# Altium footprint library GyokuRe.PcbLib: 1248 footprints (part 49 of 78)
Each footprint in its own frame and in the unit in brackets; x right, y up, seen from the top. Pads: shape width x height; smd on the part's side, far side on the other; paste and mask are expansions set on the pad; w line width, h text height; cw(c..) or ccw(c..) is an arc to the next point about the centre after c.
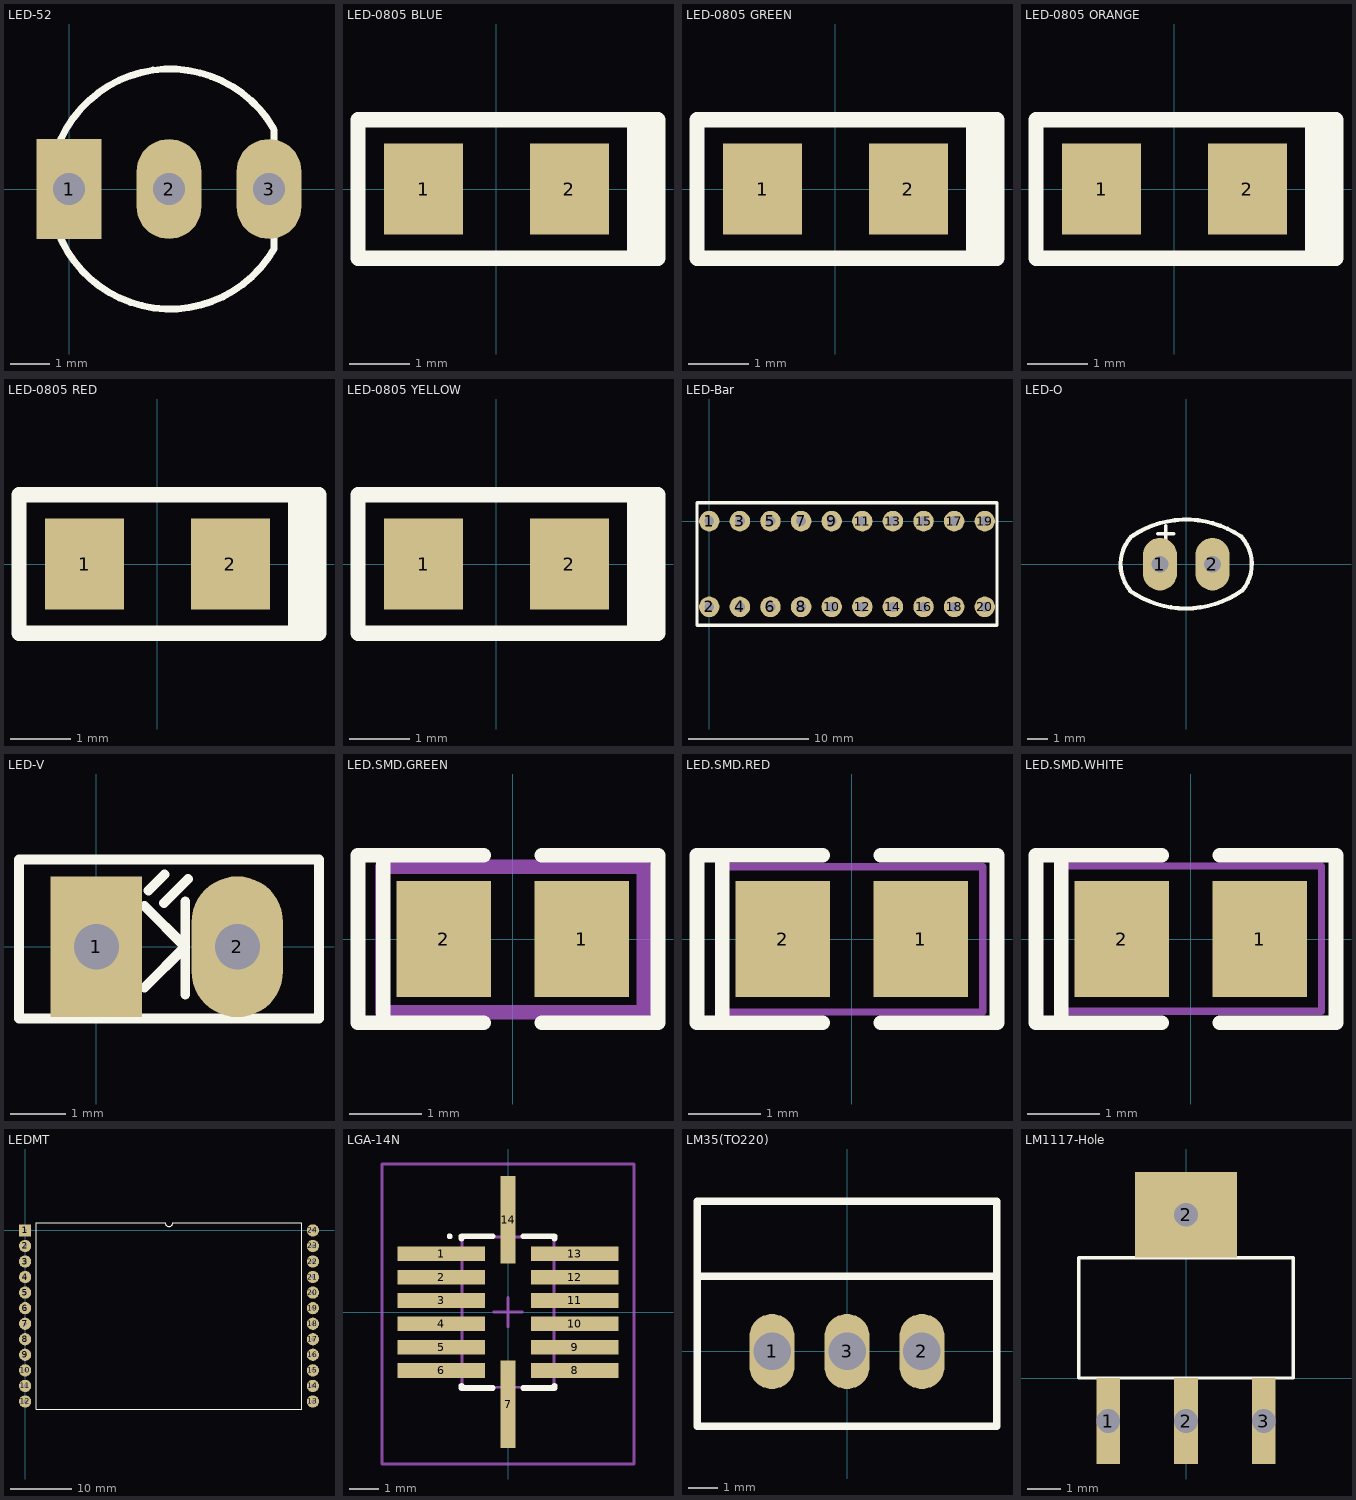
[diagram p48: the footprints below, top view; thin cyan lines are the x and y axes]

## LED-52 [mil] "LED 3 PIN, 5 ly , Two colour"
height 300
pads (3):
  rect 65x100 hole 32: 1(0,0)
  oval 65x100 hole 32: 2(100,0) 3(200,0)
Top Overlay:
  lines w7: 204.51,60.71 ccw(c101,0) 204.94,-59.97 ; 205,-59 205,59

## LED-0805 BLUE [mm] "Chip LED; BLUE; Body 2.0 x 1.3 mm (LxW typ) [2012]"
height 0.65
pads (2):
  rect 1.3x1.5 smd: 1(-1.204,0) 2(1.204,0)
Top Overlay:
  lines w0.254: 2.286,-1.143 2.286,1.143 ; 2.413,-1.143 2.413,1.143 ; 2.54,-1.143 2.54,1.143 ; -2.286,-1.143 2.667,-1.143 2.667,1.143 -2.286,1.143 -2.286,-1.143
3D body "User Library-led_0805(2).step": height 1.1, standoff 0, extent -1.006,-0.628 1.014,0.622

## LED-0805 GREEN [mm] "Chip LED; GREEN; Body 2.0 x 1.3 mm (LxW typ) [2012]"
height 0.65
pads (2):
  rect 1.3x1.5 smd: 1(-1.204,0) 2(1.204,0)
Top Overlay:
  lines w0.254: 2.286,-1.143 2.286,1.143 ; 2.413,-1.143 2.413,1.143 ; 2.54,-1.143 2.54,1.143 ; -2.286,-1.143 -2.286,1.143 2.667,1.143 2.667,-1.143 -2.286,-1.143
3D body "User Library-led_0805(1).step": height 1.1, standoff 0, extent -1.006,-0.628 1.014,0.622

## LED-0805 ORANGE [mm] "Chip LED; ORANGE; Body 2.0 x 1.3 mm (LxW typ) [2012]"
height 0.65
pads (2):
  rect 1.3x1.5 smd: 1(-1.204,0) 2(1.204,0)
Top Overlay:
  lines w0.254: 2.286,-1.143 2.286,1.143 ; 2.413,-1.143 2.413,1.143 ; 2.54,-1.143 2.54,1.143 ; -2.286,-1.143 -2.286,1.143 2.667,1.143 2.667,-1.143 -2.286,-1.143
3D body "User Library-led_0805(4).step": height 1.1, standoff 0, extent -1.006,-0.628 1.014,0.622

## LED-0805 RED [mm] "Chip LED; RED; Body 2.0 x 1.3 mm (LxW typ) [2012]"
height 0.65
pads (2):
  rect 1.3x1.5 smd: 1(-1.204,0) 2(1.204,0)
Top Overlay:
  lines w0.254: 2.286,-1.143 2.286,1.143 ; 2.413,-1.143 2.413,1.143 ; 2.54,-1.143 2.54,1.143 ; -2.286,-1.143 -2.286,1.143 2.667,1.143 2.667,-1.143 -2.286,-1.143
3D body "User Library-led_0805.step": height 1.1, standoff 0, extent -1.006,-0.628 1.014,0.622

## LED-0805 YELLOW [mm] "Chip LED; YELLOW; Body 2.0 x 1.3 mm (LxW typ) [2012]"
height 0.65
pads (2):
  rect 1.3x1.5 smd: 1(-1.204,0) 2(1.204,0)
Top Overlay:
  lines w0.254: 2.286,-1.143 2.286,1.143 ; 2.413,-1.143 2.413,1.143 ; 2.54,-1.143 2.54,1.143 ; -2.286,-1.143 -2.286,1.143 2.667,1.143 2.667,-1.143 -2.286,-1.143
3D body "User Library-led_0805(3).step": height 1.1, standoff 0, extent -1.006,-0.628 1.014,0.622

## LED-Bar [mil] "LED Bar; 10 Indicator; Solder Pad 35mil"
pads (20):
  round 67 hole 32: 1(0,0) 2(0,-280) 3(100,0) 4(100,-280) 5(200,0) 6(200,-280) 7(300,0) 8(300,-280) 9(400,0) 10(400,-280) 11(500,0) 12(500,-280) 13(600,0) 14(600,-280) 15(700,0) 16(700,-280) 17(800,0) 18(800,-280) 19(900,0) 20(900,-280)
Top Overlay:
  lines w10: -40,-340 -40,60 940,60 940,-340 -40,-340

## LED-O [mil] "LED 2 PIN,  Ovan Only colour, pin to pin 110mil"
height 300
pads (2):
  oval 65x100 hole 32: 1(-50,0) 2(50,0)
Top Overlay:
  lines w7: -54,58 -24,58 ; -39,43 -39,73
  lines w8: -106.82,-49.85 cw(c-47,0) -104.5,52.5 ; -106.38,-51.11 ccw(c-0.81,100.81) 104.97,-50.96 ; -102.83,53.79 cw(c0,-100) 103.93,53.04 ; 104.5,52.5 cw(c47,0) 106.82,-49.85

## LED-V [mil] "LED 2 PIN, Rectang Only colour"
height 300
pads (2):
  rect 65x100 hole 32: 1(0,0)
  oval 65x100 hole 32: 2(100,0)
Top Overlay:
  lines w7: 34,-29 63,0 34,29 ; 37,40 48.3,51.3 ; 48,31 65,48 ; 63,-34 63,32 ; -55,-51 -55,62 158,62 158,-51 -55,-51

## LED.SMD.GREEN [mm]
pads (2):
  rect 1.3x1.6 smd: 1(0.948,0.006) 2(-0.952,0.006)
Top Overlay:
  lines w0.2: -1.782,-1.144 -1.782,1.156 ; -0.402,-1.144 -2.132,-1.144 -2.132,1.156 -0.402,1.156 ; 0.398,-1.144 1.998,-1.144 1.998,1.156 0.398,1.156
Mechanical 13:
  lines w0.2: -1.8,-1 -1.8,1 1.8,1 1.8,-1 -1.8,-1
3D body: height 1.14, standoff 0.61, extent -0.699,-0.635 0.699,0.635
3D body: height 0.61, standoff 0, extent -1.079,-0.635 1.079,0.635

## LED.SMD.RED [mm]
pads (2):
  rect 1.3x1.6 smd: 1(0.948,0.006) 2(-0.952,0.006)
Top Overlay:
  lines w0.2: -1.782,-1.144 -1.782,1.156 ; -0.402,-1.144 -2.132,-1.144 -2.132,1.156 -0.402,1.156 ; 0.398,-1.144 1.998,-1.144 1.998,1.156 0.398,1.156
Mechanical 13:
  lines w0.1: -1.8,-1 -1.8,1 1.8,1 1.8,-1 -1.8,-1
3D body: height 1.14, standoff 0.61, extent -0.699,-0.635 0.699,0.635
3D body: height 0.61, standoff 0, extent -1.079,-0.635 1.079,0.635

## LED.SMD.WHITE [mm]
pads (2):
  rect 1.3x1.6 smd: 1(0.948,0.006) 2(-0.952,0.006)
Top Overlay:
  lines w0.2: -1.782,-1.144 -1.782,1.156 ; -0.402,-1.144 -2.132,-1.144 -2.132,1.156 -0.402,1.156 ; 0.398,-1.144 1.998,-1.144 1.998,1.156 0.398,1.156
Mechanical 13:
  lines w0.1: -1.803,-0.991 -1.803,1.009 1.797,1.009 1.797,-0.991 -1.803,-0.991
3D body: height 1.14, standoff 0.61, extent -0.699,-0.635 0.699,0.635
3D body: height 0.61, standoff 0, extent -1.079,-0.635 1.079,0.635

## LEDMT [mm] "led matrix 8x8 dual color"
pads (24):
  rect 2x2 hole 0.6: 1(0,0)
  round 2 hole 0.6: 2(0,-2.54) 3(0,-5.08) 4(0,-7.62) 5(0,-10.16) 6(0,-12.7) 7(0,-15.24) 8(0,-17.78) 9(0,-20.32) 10(0,-22.86) 11(0,-25.4) 12(0,-27.94) 13(47,-27.94) 14(47,-25.4) 15(47,-22.86) 16(47,-20.32) 17(47,-17.78) 18(47,-15.24) 19(47,-12.7) 20(47,-10.16) 21(47,-7.62) 22(47,-5.08) 23(47,-2.54) 24(47,0)
Top Overlay:
  lines w0.2: 1.835,-29.21 45.165,-29.21 45.165,1.27 24.135,1.27 cw(c23.5,1.27) 22.865,1.27 1.835,1.27 1.835,-29.21

## LGA-14N [mm] "LGA, 14-Leads, Body 3x5x0.92mm, Pitch 0.8mm, IPC Medium Density"
height 1
pads (14):
  rect 3x0.5 smd: 1(-2.291,2) 2(-2.291,1.2) 3(-2.291,0.4) 4(-2.291,-0.4) 5(-2.291,-1.2) 6(-2.291,-2) 8(2.291,-2) 9(2.291,-1.2) 10(2.291,-0.4) 11(2.291,0.4) 12(2.291,1.2) 13(2.291,2)
  rect 0.5x3 smd: 7(0,-3.164) 14(0,3.164)
Top Overlay:
  circle w0.1: c-2,2.6 r0.05
  lines w0.2: -1.6,-2.525 -1.6,-2.6 -0.525,-2.6 ; -1.6,2.525 -1.6,2.6 -0.525,2.6 ; 0.525,-2.6 1.6,-2.6 1.6,-2.525 ; 0.525,2.6 1.6,2.6 1.6,2.525
Mechanical 13:
  lines w0.1: -1.575,-2.575 -1.575,2.575 1.575,2.575 1.575,-2.575 -1.575,-2.575
Mechanical 15:
  lines w0.1: -0.5,0 0.5,0 ; 0,-0.5 0,0.5 ; -4.318,-5.207 -4.318,5.08 4.318,5.08 4.318,-5.207 -4.318,-5.207
3D body "SW3dPS-LGA-14.STEP": height 1.03, standoff -0.4, extent -1.499,-2.5 1.501,2.5

## LM35(TO220) [mil]
pads (3):
  oval 60x100 hole 50: 1(-100,0) 2(100,0) 3(0,0)
Top Overlay:
  lines w10: -200,100 -200,-100 200,-100 200,100 ; -200,100 200,100 ; -200,100 -200,200 200,200 200,100

## LM1117-Hole [mm]
pads (4):
  rect 0.7x2.54 hole 0.7: 1(-2.3,-1.27) 2(0,-1.27) 3(2.3,-1.27)
  rect 3x2.54 hole 0.7: 2(0,4.826)
Top Overlay:
  lines w0.1: -3.175,0 3.175,0 3.175,3.556 -3.175,3.556 -3.175,0
3D body "SW3DPS-SOT-223-DEFAULT.step": height 1.68, standoff 0, extent -3.25,-1.702 3.25,5.258